# Altium integrated library MS-Electronic.IntLib: 363 symbols (part 1 of 2) (continued)
## Fuse_0ZCJ0012FF2E (continued)
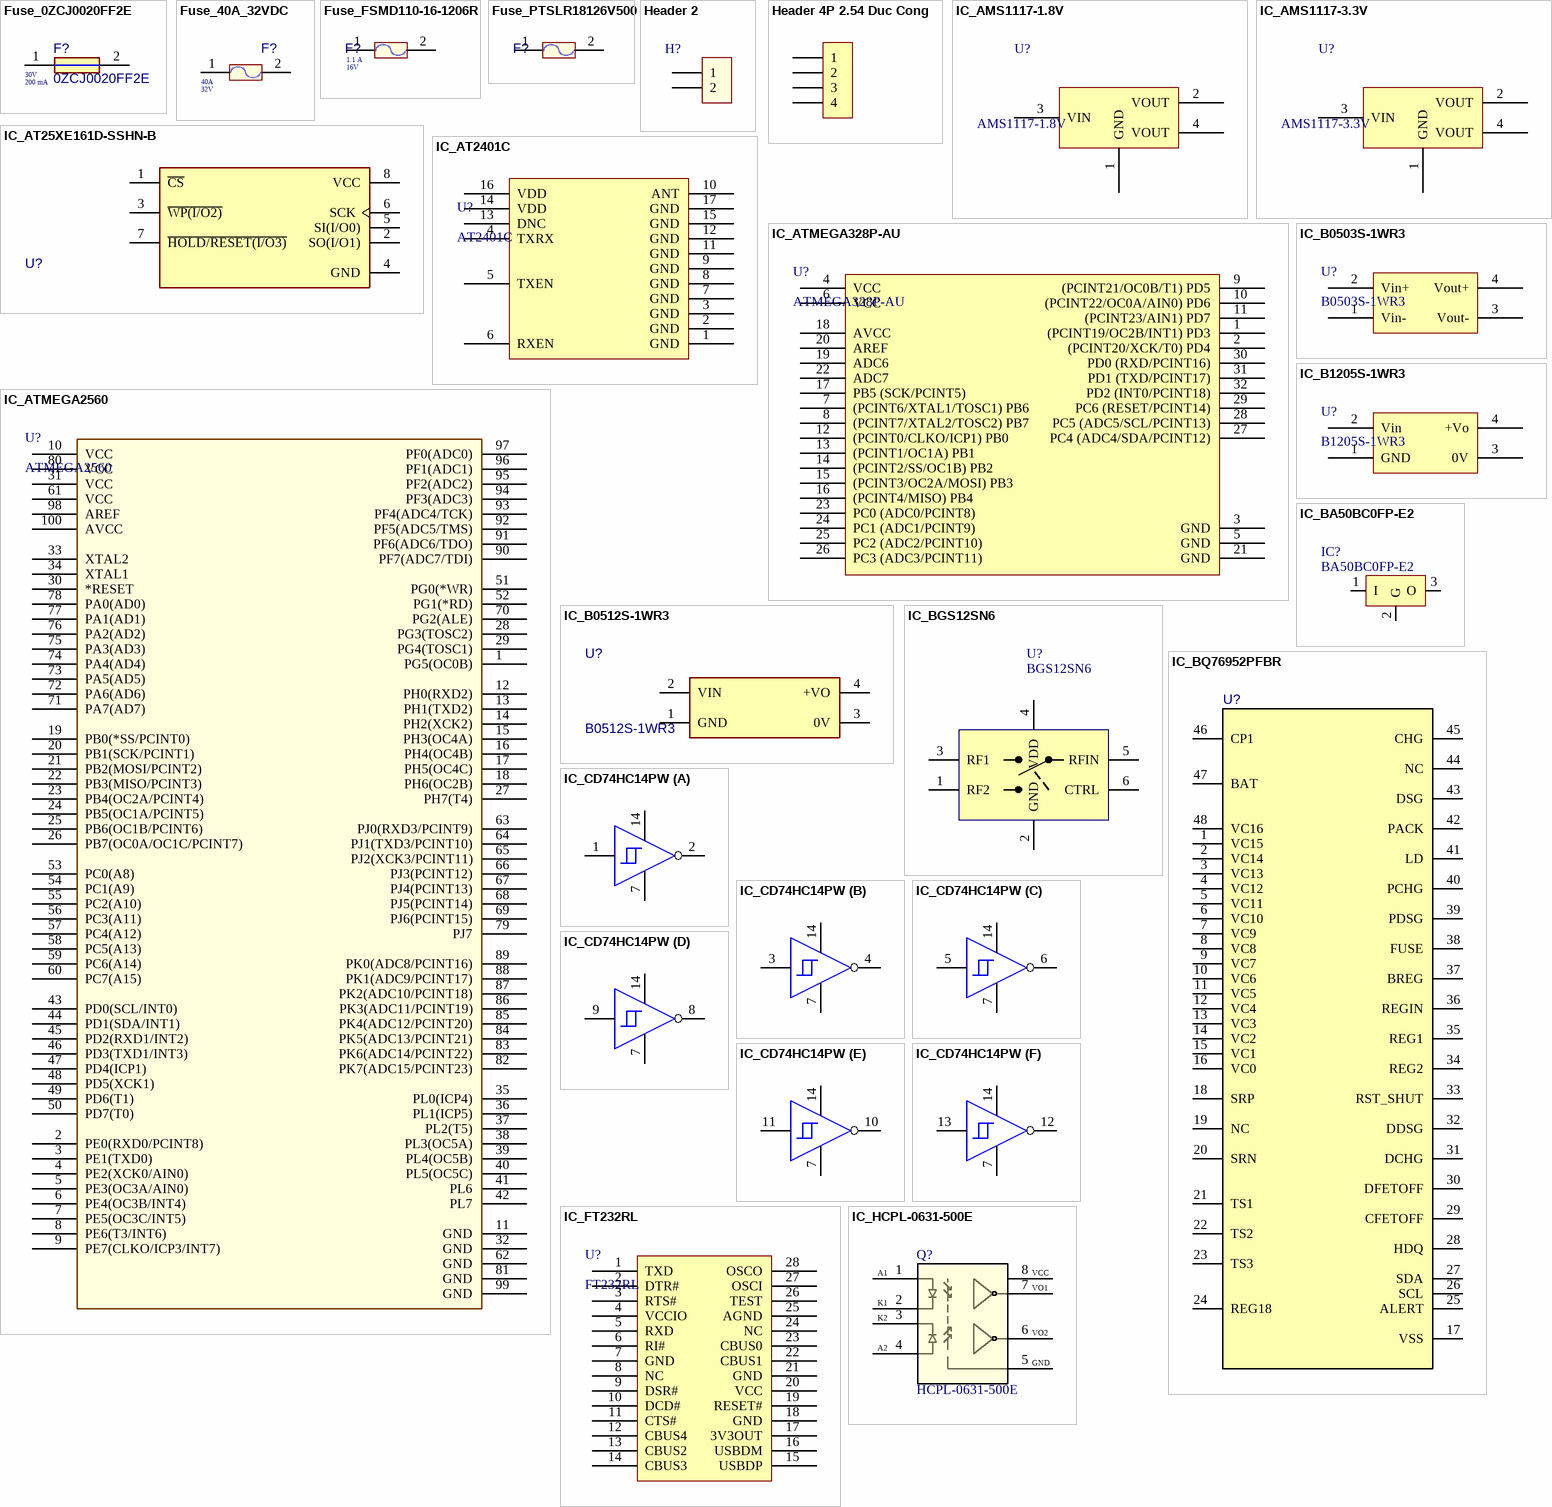
[diagram p3: symbols Fuse_0ZCJ0020FF2E to IC_HCPL-0631-500E]

## Fuse_0ZCJ0020FF2E
designator F?, comment 0ZCJ0020FF2E  Current - Hold (Ih) (Max): 200 mA  Voltage - Max: 30V
PTC RESET FUSE 30V 200MA 1206; Manufacturer: Bel Circuit Protection; Current - Trip (It): 400 mA; Current - Max: 10 A; Part Number: 0ZCJ0020FF2E; Description SEL: PTC RESET FUSE 30V 200MA 1206; Size: 1206; ComponentLink1Description: TGIC; ComponentLink1URL: https://www.thegioiic.com/0zcj0020ff2e-cau-chi-tu-phuc-hoi-1206-30v-200ma; ComponentLink2Description: DIGIKEY; ComponentLink2URL: https://www.digikey.com/en/products/detail/bel-fuse-inc/0ZCJ0020FF2E/4156326; Sort: PTC RESET
footprint FUSE_0ZCJ0020FF2E
pins: 1, 2

## Fuse_40A_32VDC
designator F?, comment Voltage Rating - DC: 32V  Current Rating (Amps): 40A  (hidden comment: 0287030.PXCN)
40 A AC 32 V DC Fuse Automotive Requires Holder Blade, ATO/ATC; Manufacturer: LITTELFUSE; Part Number: 0287040.PXCN; Description SEL: FUSE AUTOMOTIVE 40A 32VDC BLADE; Sort: AUTO; Footprint Type: TH; ComponentLink1Description: LKCL; ComponentLink1URL: https://linhkienchatluong.vn/cau-chi-dep-o-to-xe-may/cau-chi-dep-40a-32v-chan-nho-cho-o-to-xe-may_sp996_ct14638.aspx; ComponentLink2Description: DIGIKEY; ComponentLink2URL: https://www.digikey.bg/en/products/detail/littelfuse-inc/0287040-PXCN/2519817?s=N4IgTCBcDaIAxgBwHY4BY4DoAKANAwgHIgC6AvkA; Package: 0.752" L x 0.201" W x 0.484" H (19.10mm x 5.10mm x 12.30mm)
footprint FUSE_TH_30A
pins: 1, 2

## Fuse_FSMD110-16-1206R
designator F?, comment Voltage - Max: 16V  Current - Hold (Ih) (Max): 1.1 A  (hidden comment: FSMD110-16-1206R)
RESETTABLE FUSE - SMD, 1206 SIZE; Current - Trip (It): 2.2 A; Current - Max: 100 A; Description SEL: RESETTABLE FUSE - SMD, 1206 SIZE; Part Number: FSMD110-16-1206R; ComponentLink1Description: New link; Sort: RESETTABLE; Package: 1206
footprint FUSE_1206
pins: 1, 2

## Fuse_PTSLR18126V500
designator F?, comment PTSLR18126V500  (value not drawn)
Polymeric PTC Resettable Fuse 6V 5 A Ih Surface Mount 1812 (4532 Metric), Concave; Manufacturer: Eaton - Electronics Division; Value: 5A/6V; Manufacturer Part Number: PTSLR18126V500; ComponentLink1Description: DIGIKEY; ComponentLink1URL: https://www.digikey.bg/en/products/detail/eaton-electronics-division/PTSLR18126V500/12313952; ComponentLink2Description: CXT; ComponentLink2URL: https://linhkien.cxtvn.com/8771-cau-chi-tu-phuc-hoi-pptc-smd1812.html
footprint FUSE_0ZCG0200AF2B
pins: 1, 2

## Header 2
designator H?
Header 2 (Green); Voltage: 300V; Current: 15A; Pitch: 5.08mm; ComponentLink1Description: BLK; ComponentLink1URL: https://banlinhkien.com/con-2-2edg5.082p-5.08mm-xanh-cong-p6651835.html
footprint Header2T
pins: 1, 2

## Header 4P 2.54 Duc Cong
designator H?  (value not drawn)
Header 4P XH2.54-4P Đực Cong; Pitch: 2.54mm; Number Pin: 4; ComponentLink1Description: BLK; ComponentLink1URL: https://banlinhkien.com/header-4p-xh2.544p-duc-cong-10-chiec-p22290874.html
footprint Header 4P 2.54 Duc Cong
pins: 1, 2, 3, 4

## IC_AMS1117-1.8V
designator U?, comment AMS1117-1.8V
Linear Voltage Regulator IC Positive Fixed 1 Output 1A SOT-223-3L; Vout: 1.8V; Vin Max: 18V; ComponentLink1Description: BLK; ComponentLink1URL: https://banlinhkien.com/ams11171.8v-sot223-p6651250.html; Current Max: 1A; Package: SOT-223; Sort: SOT-223
footprint SOT223
pins: 1 GND, 2 VOUT, 3 VIN, 4 VOUT

## IC_AMS1117-3.3V
designator U?, comment AMS1117-3.3V
Linear Voltage Regulator IC Positive Fixed 1 Output 1A SOT-223-3L; Vin Max: 15V; Vout: 3.3; Sort: LDO; ComponentLink1Description: BLK; ComponentLink1URL: https://banlinhkien.com/ams11173.3v-sot223-p6651251.html; Current Max: 1A; Package: SOT-223
footprint SOT223
pins: 1 GND, 2 VOUT, 3 VIN, 4 VOUT

## IC_AT25XE161D-SSHN-B
designator U?, comment AT25XE161D-SSHN-B  (value not drawn)
NOR Flash 16 Mbit, Wide Vcc (1.65V to 3.6V); Manufacturer: Renesas Electronics Corporation; Description SEL: IC FLASH 16MBIT SPI/QUAD 8SOIC; Cross Component: W25Q80DVSSIG; Part Number: AT25XE161D-SSHN-B; ComponentLink1Description: DIGIKEY; ComponentLink1URL: https://www.digikey.bg/en/products/detail/renesas-electronics-corporation/AT25XE161D-SSHN-B/18717039; Sort: FLASH
footprint IC_AT25XE161D-SSHN-B
pins: 1 ~{CS}, 2 SO(I/O1), 3 ~{WP(I/O2)}, 4 GND, 5 SI(I/O0), 6 SCK, 7 ~{HOLD/RESET(I/O3)}, 8 VCC

## IC_AT2401C
designator U?, comment AT2401C
ZigBee 2V~3.6V QFN-16-EP(3x3) RF Front End Circuits ROHS; Sort: RF and Wireless; ComponentLink1Description: Aliexpress; ComponentLink1URL: https://vi.aliexpress.com/i/1005004853615083.html?gatewayAdapt=glo2vnm; Package: QFN-16-EP(3x3); ComponentLink2Description: LCSC; ComponentLink2URL: https://www.lcsc.com/product-detail/RF-Front-End-Circuits_ZHONGKEWEI-AT2401C_C783588.html
footprint IC_AT2401C
pins: 1 GND, 2 GND, 3 GND, 4 TXRX, 5 TXEN, 6 RXEN, 7 GND, 8 GND, 9 GND, 10 ANT, 11 GND, 12 GND, 13 DNC, 14 VDD, 15 GND, 16 VDD, 17 GND

## IC_ATMEGA328P-AU
designator U?, comment ATMEGA328P-AU
AVR AVR® ATmega Microcontroller IC 8-Bit 20MHz 32KB (16K x 16) FLASH 32-TQFP (7x7); Sort: MCU; ComponentLink1Description: New link; ComponentLink1URL: https://banlinhkien.com/atmega328pau-tqfp32-p6653725.html; Package: 32-TQFP
footprint IC_ATMEGA328P-AU
pins: 1 (PCINT19/OC2B/INT1) PD3, 2 (PCINT20/XCK/T0) PD4, 3 GND, 4 VCC, 5 GND, 6 VCC, 7 (PCINT6/XTAL1/TOSC1) PB6, 8 (PCINT7/XTAL2/TOSC2) PB7, 9 (PCINT21/OC0B/T1) PD5, 10 (PCINT22/OC0A/AIN0) PD6, 11 (PCINT23/AIN1) PD7, 12 (PCINT0/CLKO/ICP1) PB0, 13 (PCINT1/OC1A) PB1, 14 (PCINT2/SS/OC1B) PB2, 15 (PCINT3/OC2A/MOSI) PB3, 16 (PCINT4/MISO) PB4, 17 PB5 (SCK/PCINT5), 18 AVCC, 19 ADC6, 20 AREF, 21 GND, 22 ADC7, 23 PC0 (ADC0/PCINT8), 24 PC1 (ADC1/PCINT9), 25 PC2 (ADC2/PCINT10), 26 PC3 (ADC3/PCINT11), 27 PC4 (ADC4/SDA/PCINT12), 28 PC5 (ADC5/SCL/PCINT13), 29 PC6 (RESET/PCINT14), 30 PD0 (RXD/PCINT16), 31 PD1 (TXD/PCINT17), 32 PD2 (INT0/PCINT18)

## IC_ATMEGA2560
designator U?, comment ATMEGA2560
AVR AVR® ATmega Microcontroller IC 8-Bit 16MHz 256KB (128K x 16) FLASH 100-TQFP (14x14); Sort: MCU; ComponentLink1Description: New link; ComponentLink1URL: https://banlinhkien.com/atmega256016au-tqfp100-p6649411.html; Package: 100-TQFP
footprint IC_ATMEGA2560AU
pins: 1 PG5(OC0B), 2 PE0(RXD0/PCINT8), 3 PE1(TXD0), 4 PE2(XCK0/AIN0), 5 PE3(OC3A/AIN0), 6 PE4(OC3B/INT4), 7 PE5(OC3C/INT5), 8 PE6(T3/INT6), 9 PE7(CLKO/ICP3/INT7), 10 VCC, 11 GND, 12 PH0(RXD2), 13 PH1(TXD2), 14 PH2(XCK2), 15 PH3(OC4A), 16 PH4(OC4B), 17 PH5(OC4C), 18 PH6(OC2B), 19 PB0(*SS/PCINT0), 20 PB1(SCK/PCINT1), 21 PB2(MOSI/PCINT2), 22 PB3(MISO/PCINT3), 23 PB4(OC2A/PCINT4), 24 PB5(OC1A/PCINT5), 25 PB6(OC1B/PCINT6), 26 PB7(OC0A/OC1C/PCINT7), 27 PH7(T4), 28 PG3(TOSC2), 29 PG4(TOSC1), 30 *RESET, 31 VCC, 32 GND, 33 XTAL2, 34 XTAL1, 35 PL0(ICP4), 36 PL1(ICP5), 37 PL2(T5), 38 PL3(OC5A), 39 PL4(OC5B), 40 PL5(OC5C), 41 PL6, 42 PL7, 43 PD0(SCL/INT0), 44 PD1(SDA/INT1), 45 PD2(RXD1/INT2), 46 PD3(TXD1/INT3), 47 PD4(ICP1), 48 PD5(XCK1), 49 PD6(T1), 50 PD7(T0), 51 PG0(*WR), 52 PG1(*RD), 53 PC0(A8), 54 PC1(A9), 55 PC2(A10), 56 PC3(A11), 57 PC4(A12), 58 PC5(A13), 59 PC6(A14), 60 PC7(A15), 61 VCC, 62 GND, 63 PJ0(RXD3/PCINT9), 64 PJ1(TXD3/PCINT10), 65 PJ2(XCK3/PCINT11), 66 PJ3(PCINT12), 67 PJ4(PCINT13), 68 PJ5(PCINT14), 69 PJ6(PCINT15), 70 PG2(ALE), 71 PA7(AD7), 72 PA6(AD6), 73 PA5(AD5), 74 PA4(AD4), 75 PA3(AD3), 76 PA2(AD2), 77 PA1(AD1), 78 PA0(AD0), 79 PJ7, 80 VCC, 81 GND, 82 PK7(ADC15/PCINT23), 83 PK6(ADC14/PCINT22), 84 PK5(ADC13/PCINT21), 85 PK4(ADC12/PCINT20), 86 PK3(ADC11/PCINT19), 87 PK2(ADC10/PCINT18), 88 PK1(ADC9/PCINT17), 89 PK0(ADC8/PCINT16), 90 PF7(ADC7/TDI), 91 PF6(ADC6/TDO), 92 PF5(ADC5/TMS), 93 PF4(ADC4/TCK), 94 PF3(ADC3), 95 PF2(ADC2), 96 PF1(ADC1), 97 PF0(ADC0), 98 AREF, 99 GND, 100 AVCC

## IC_B0503S-1WR3
designator U?, comment B0503S-1WR3
Isolated Module DC DC Converter 1 Output 3.3V 303mA 4.5V - 5.5V Input; Sort: Module Isolated DC-DC; ComponentLink1Description: HS; ComponentLink1URL: https://hshop.vn/nguon-cach-ly-dc-dc-isolated-power-module-hi-link-hlk-b0503s-1wr3-5vdc-to-3-3vdc-1w; ComponentLink2Description: DIGIKEY; ComponentLink2URL: https://www.digikey.bg/en/products/detail/mornsun-america-llc/B0503S-1WR3/13168314?s=N4IgTCBcDaIEIAYCsCDMBlAtARgOoCVUQBdAXyA
footprint IC_B0503S-1WR3
pins: 1 Vin-, 2 Vin+, 3 Vout-, 4 Vout+

## IC_B0512S-1WR3
designator U?, comment B0512S-1WR3
Isolated Module DC DC Converter 1 Output 12V 84mA 4.5V - 5.5V Input; Power: 1W; Description SEL: DC DC CONVERTER 12V 1W; Part Number: B0512S-1WR3; Input: 4.5V-5.5V; Output: 12V; Current: 84mA; ComponentLink1Description: CXT; ComponentLink1URL: https://linhkien.cxtvn.com/6106-b0512s-1wr3-dc-dc-converter-12v-1w.html; ComponentLink2Description: DIGIKEY; ComponentLink2URL: https://www.digikey.at/en/products/detail/mornsun-america-llc/B0512S-1WR3/13168229?s=N4IgTCBcDaIEIAYCsBGMBlAtCg6gJQGYQBdAXyA
footprint IC_ROE-0512S
pins: 1 GND (power), 2 VIN, 3 0V, 4 +VO

## IC_B1205S-1WR3
designator U?, comment B1205S-1WR3
Isolated Module DC DC Converter 1 Output 5V 200mA 10.8V - 13.2V Input; Sort: DC DC CONVERTER 5V 1W; ComponentLink1Description: HS; ComponentLink1URL: https://hshop.vn/nguon-cach-ly-dc-dc-isolated-power-module-hi-link-hlk-b1205s-1wr3-12vdc-to-5vdc-1w; ComponentLink2Description: DIGIKEY; ComponentLink2URL: https://www.digikey.com/en/products/detail/mornsun-america-llc/B1205S-1WR3/13968668?s=N4IgTCBcDaIEIEYwAYCsBlAtAg6gJQGYQBdAXyA
footprint IC_B0503S-1WR3
pins: 1 GND, 2 Vin, 3 0V, 4 +Vo

## IC_BA50BC0FP-E2
designator IC?, comment BA50BC0FP-E2
IC REG LINEAR 5V 1A TO252-2; Manufacture: Rohm Semiconductor; ComponentLink2Description: DIGIKEY; ComponentLink2URL: https://www.digikey.com/en/products/detail/rohm-semiconductor/BA50BC0FP-E2/722207?s=N4IgTCBcDaIEIEECsAGOBhFAxACgWgFEIBdAXyA; Footprint type: SMD; Category: IC; Part Number: BA50BC0FP-E2
footprint IC_BA50BC0FP-E2
pins: 1 I (power), 2 G (power), 3 O (power)

## IC_BGS12SN6
designator U?, comment BGS12SN6
DC switch - Ultra-Low  SPDT analog switch; Manufacturer: INFINEON; Sort: RF Switch; Manufacturer_Part_Number: BGS12SN6; ComponentLink1Description: MOUSER; ComponentLink1URL: https://www.mouser.vn/ProductDetail/Infineon-Technologies/BGS12SN6E6327XTSA1?qs=3%2FhYFTG7CVeGtqdjCCQooA%3D%3D
footprint SON40P70X40-6N (SON, 6-Leads, Body 1.10x0.70mm, Pitch 0.40mm)
pins: 1 RF2, 2 GND, 3 RF1, 4 VDD, 5 RFIN, 6 CTRL

## IC_BQ76952PFBR
designator U?, comment BQ76952PFBR  (value not drawn)
IC BAT LIFEPO4/LI-ION 3-16C TQFP; Manufacturer: Texas Instruments; Point: 48; Part Number: BQ76952PFBR; Description SEL: IC BAT LIFEPO4/LI-ION 3-16C TQFP; ComponentLink1Description: DIGIKEY; ComponentLink1URL: https://www.digikey.com/en/products/detail/texas-instruments/BQ76952PFBR/13427864
footprint IC_BQ76952PFBR
pins: 1 VC15, 2 VC14, 3 VC13, 4 VC12, 5 VC11, 6 VC10, 7 VC9, 8 VC8, 9 VC7, 10 VC6, 11 VC5, 12 VC4, 13 VC3, 14 VC2, 15 VC1, 16 VC0, 17 VSS, 18 SRP, 19 NC, 20 SRN, 21 TS1, 22 TS2, 23 TS3, 24 REG18, 25 ALERT, 26 SCL, 27 SDA, 28 HDQ, 29 CFETOFF, 30 DFETOFF, 31 DCHG, 32 DDSG, 33 RST_SHUT, 34 REG2, 35 REG1, 36 REGIN, 37 BREG, 38 FUSE, 39 PDSG, 40 PCHG, 41 LD, 42 PACK, 43 DSG, 44 NC, 45 CHG, 46 CP1, 47 BAT, 48 VC16

## IC_CD74HC14PW
designator U?, comment CD74HC14PW  (value not drawn)
IC INVERTER 6CH 1-INP 14TSSOP; Manufacturer: Texas Instruments; Voltage - Supply: 2V ~ 6V; Input Logic Level - Low: 0.3V ~ 1.2V; Input Logic Level - High: 1.5V ~ 4.2V; Number of Chanel: 6; Part Number: CD74HC14PW; Footprint/Package: 14-TSSOP; Sort: IC INVERTER; ComponentLink1Description: DIGIKEY; ComponentLink1URL: https://www.digikey.com/en/products/detail/texas-instruments/CD74HC14PW/1506665
footprint IC_CD74HC14PW
part A pins: 1 1A, 2 1Y, 7 GND, 14 VCC
part B pins: 3 2A, 4 2Y, 7 GND, 14 VCC
part C pins: 5 3A, 6 3Y, 7 GND, 14 VCC
part D pins: 7 GND, 8 4Y, 9 4A, 14 VCC
part E pins: 7 GND, 10 5Y, 11 5A, 14 VCC
part F pins: 7 GND, 12 6Y, 13 6A, 14 VCC

## IC_FT232RL
designator U?, comment FT232RL
USB FULL SPEED TO SERIAL UART IC; Sort: USB FS SERIAL UART; ComponentLink1Description: LKCG; ComponentLink1URL: https://lkcg.vn/linh-kien-ic-ft232rl-chan-dan-ssop28; ComponentLink2Description: DIGIKEY; ComponentLink2URL: https://www.digikey.bg/en/products/detail/ftdi-future-technology-devices-international-ltd/FT232RNL-REEL/16836345
footprint IC_FT232RL
pins: 1 TXD, 2 DTR#, 3 RTS#, 4 VCCIO, 5 RXD, 6 RI#, 7 GND, 8 NC, 9 DSR#, 10 DCD#, 11 CTS#, 12 CBUS4, 13 CBUS2, 14 CBUS3, 15 USBDP, 16 USBDM, 17 3V3OUT, 18 GND, 19 RESET#, 20 VCC, 21 GND, 22 CBUS1, 23 CBUS0, 24 NC, 25 AGND, 26 TEST, 27 OSCI, 28 OSCO

## IC_HCPL-0631-500E
designator Q?, comment HCPL-0631-500E
OPTOISO 3.75KV 2CH OPEN COLL 8SO; Mfr_Name: Broadcom; Type: Optoisolators; ComponentLink1Description: LKD; ComponentLink1URL: https://banlinhkiendientu.vn/hcpl-0631/; ComponentLink2Description: DIGIKEY; ComponentLink2URL: https://www.digikey.com/en/products/detail/broadcom-limited/HCPL-0631-500E/768373; MSL: 1; Temperature: -40°C ~ 85°C
footprint IC_HCPL-0631-500E
pins: 1, 2, 3, 4, 5 GND, 6, 7, 8
text: A1; VCC; VO1; K1; K2; VO2; A2

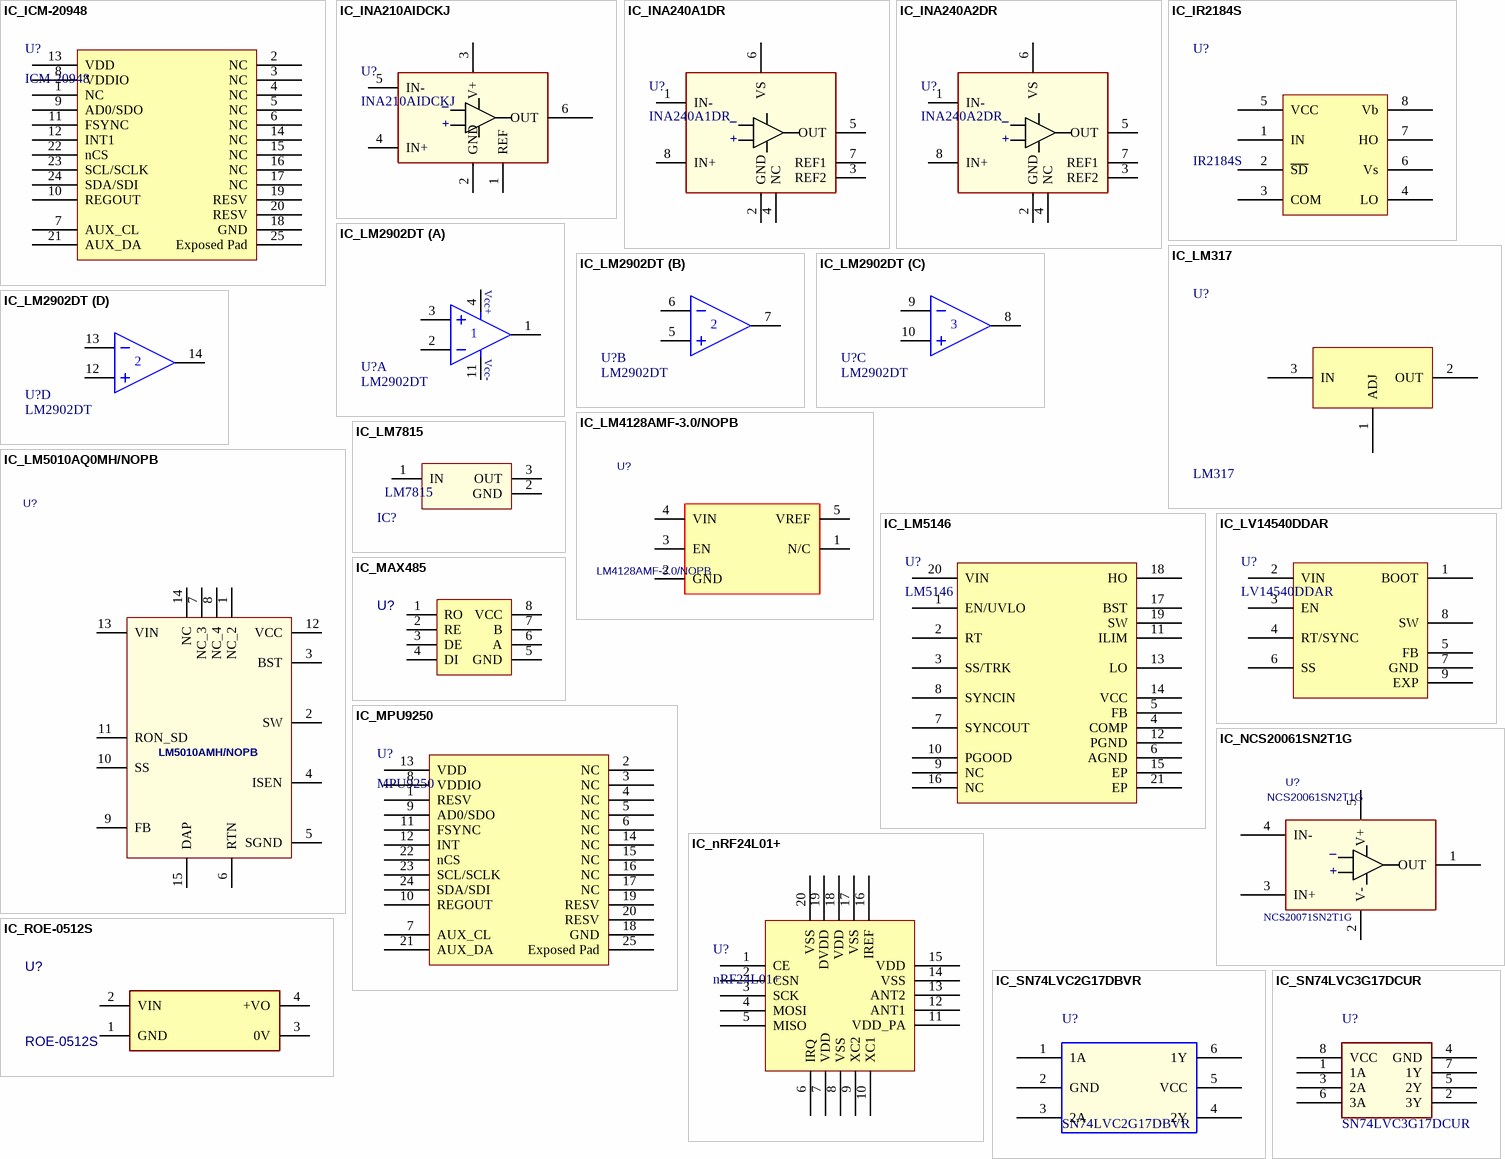
[diagram p4: symbols IC_ICM-20948 to IC_SN74LVC3G17DCUR]

## IC_ICM-20948
designator U?, comment ICM-20948
Accelerometer, Gyroscope, Magnetometer, 9 Axis Sensor I2C, SPI Output; Sort: IMU; ComponentLink1Description: DIGIKEY; ComponentLink1URL: https://www.digikey.com/en/products/detail/tdk-invensense/ICM-20948/6623535; Package: 24-QFN
footprint IC_MPU9250
pins: 1 NC, 2 NC, 3 NC, 4 NC, 5 NC, 6 NC, 7 AUX_CL, 8 VDDIO, 9 AD0/SDO, 10 REGOUT, 11 FSYNC, 12 INT1, 13 VDD, 14 NC, 15 NC, 16 NC, 17 NC, 18 GND, 19 RESV, 20 RESV, 21 AUX_DA, 22 nCS, 23 SCL/SCLK, 24 SDA/SDI, 25 Exposed Pad

## IC_INA210AIDCKJ
designator U?, comment INA210AIDCKJ
Current Sense Amplifier 1 Circuit Single-Ended SC-70-6; Manufacturer: Texas Instruments; Voltage - Supply: 2.7 - 26V; Current - Supply: 65uA; Part Number: INA210AIDCKJ; Output Type: Single-Ended; Package: SC-70-6; ComponentLink1Description: DIGIKEY; ComponentLink1URL: https://www.digikey.com/en/products/detail/texas-instruments/INA210AIDCKJ/23331470
footprint IC_INA210AIDCKJ
pins: 1 REF, 2 GND, 3 V+, 4 IN+, 5 IN-, 6 OUT
text: _; +

## IC_INA240A1DR
designator U?, comment INA240A1DR
IC CURRENT SENSE 1 CIRCUIT 8SOIC; Manufacturer: Texas Instruments; Voltage - Supply: 2.7 - 5.5V; Current - Supply: 1.8mA; Part Number: INA240A1DR; Package: 8-SOIC; ComponentLink1Description: DIGIKEY; ComponentLink1URL: https://www.digikey.com/en/products/detail/texas-instruments/INA240A1DR/8538109
footprint IC_INA240A1DR_SOIC8
pins: 1 IN-, 2 GND, 3 REF2, 4 NC, 5 OUT, 6 VS, 7 REF1, 8 IN+
text: _; +

## IC_INA240A2DR
designator U?, comment INA240A2DR
IC CURRENT SENSE 1 CIRCUIT 8SOIC; Manufacturer: Texas Instruments; Voltage - Supply: 2.7 - 5.5V; Current - Supply: 1.8mA; Part Number: INA240A2DR; Package: 8-SOIC; ComponentLink1Description: DIGIKEY; ComponentLink1URL: https://www.digikey.com/en/products/detail/texas-instruments/INA240A2DR/8538110
footprint IC_INA240A1DR_SOIC8
pins: 1 IN-, 2 GND, 3 REF2, 4 NC, 5 OUT, 6 VS, 7 REF1, 8 IN+
text: _; +

## IC_IR2184S
designator U?, comment IR2184S
Half-Bridge Driver; Manufacture: Infineon Technologies; Mouting Type: SMD; ComponentLink1Description: BLK; ComponentLink1URL: https://banlinhkien.com/ir2184s-sop8-600v-halfbridge-driver-1.4a1.8a-p6653151.html; ComponentLink2Description: Mouser; ComponentLink2URL: https://www.mouser.vn/ProductDetail/Infineon-Technologies/IR2184STRPBF?qs=ellYJlE8XiF5tKx1UCxEUw%3D%3D; Sort: Half-Bridge; Manufacture Part Number: IR2184S; MSL: 1; Temperature: -40°C ~ 150°C
footprint IC_IR2184S
pins: 1 IN, 2 ~{SD}, 3 COM, 4 LO, 5 VCC, 6 Vs, 7 HO, 8 Vb

## IC_LM317
designator U?, comment LM317
Linear Voltage Regulator IC Positive Adjustable 1 Output 1.5A TO-220; Manufacturer: Lumimax Optoelectronic Technology; Vin: 4.2V - 40V; Vout: 1.2V - 37V; Part Number: LM317; Current: 1.5A; Package: TO-220; ComponentLink1Description: BLK; ComponentLink1URL: https://banlinhkien.com/lm317t-to220-reg-ldo-adj-1.5a-p6651263.html; ComponentLink2Description: DIGIKEY; ComponentLink2URL: https://www.digikey.bg/en/products/detail/lumimax-optoelectronic-technology/LM317/24373406
footprint IC_LM7815
pins: 1 ADJ, 2 OUT, 3 IN

## IC_LM2902DT
designator U?, comment LM2902DT
IC OPAMP GP 4 CIRCUIT 14SOIC; Manufacturer: STMicroelectronics; Number of Circuits: 4; Output Type: Push-Pull; Gain Bandwidth Product: 800 kHz; Current - Input Bias: 20nA; Current - Output / Channel: 30mA; Voltage - Supply Span(Min-Max): 3-30V; Part Number: LM2902DT; Footprint/Package: 14-SOIC; Sort: OPAMP; ComponentLink1Description: DIGIKEY; ComponentLink1URL: https://www.digikey.com/en/products/detail/stmicroelectronics/LM2902DT/591659
footprint IC_LM2902DT_SOIC
part A pins: 1 OUT, 2 IN-, 3 IN+, 4 V+, 11 V-
part B pins: 5 IN+, 6 IN-, 7 OUT
part C pins: 8 OUT, 9 IN-, 10 IN+
part D pins: 12 IN+, 13 IN-, 14 OUT
part A text: Vcc+; Vcc-

## IC_LM4128AMF-3.0/NOPB
designator U?, comment LM4128AMF-3.0/NOPB
IC VREF SERIES 0.1% SOT23-5; Manufacturer: Texas Instruments; Sort: IC VREF; Vout: 3V; Current: 20 mA; Part Number: LM4128AMF-3.0/NOPB; Footprint/Package: SOT-23-THIN; Footprint type: SMD; Category: IC; ComponentLink1Description: DIGIKEY; ComponentLink1URL: https://www.digikey.com/en/products/detail/texas-instruments/LM4128AMF-3-0-NOPB/1247403
footprint DBV5_TEX-M
pins: 1 N/C, 2 GND, 3 EN, 4 VIN, 5 VREF

## IC_LM5010AQ0MH/NOPB
designator U?, comment Part Number: LM5010AMH/NOPB  (hidden comment: LM5010AQ0MH/NOPB)
IC REG BUCK ADJ 1A 14HTSSOP; Manufacturer: Texas Instruments; Application_BuildNumber: LM5010AQ0MH/NOPB; Footprint/Package: 14-HTSSOP; Footprint type: SMD; Category: IC
footprint IC_LM5010AQ0MH/NOPB
pins: 1 NC_2, 2 SW (power), 3 BST (power), 4 ISEN, 5 SGND (power), 6 RTN (power), 7 NC_3, 8 NC_4, 9 FB, 10 SS, 11 RON_SD, 12 VCC (power), 13 VIN (power), 14 NC, 15 DAP (power)

## IC_LM5146
designator U?, comment LM5146
Buck Regulator Positive Output Step-Down DC-DC Controller IC 20-VQFN (3.5x4.5); Manufacturer: Texas Instruments; Part Number: LM5146RGYR; Sort: IC REG BUCK; MSL: 2; ComponentLink1Description: DIGIKEY; ComponentLink1URL: https://www.digikey.bg/en/products/detail/texas-instruments/LM5146RGYR/14544372
footprint IC_LM5146
pins: 1 EN/UVLO, 2 RT, 3 SS/TRK, 4 COMP, 5 FB, 6 AGND, 7 SYNCOUT, 8 SYNCIN, 9 NC, 10 PGOOD, 11 ILIM, 12 PGND, 13 LO, 14 VCC, 15 EP, 16 NC, 17 BST, 18 HO, 19 SW, 20 VIN, 21 EP

## IC_LM7815
designator IC?, comment LM7815
Linear Voltage Regulator IC Positive Fixed 1 Output 1A TO-220-3; Manufacturer: Texas Instruments; Part Number: LM7815CT/NOPB; Vin: 35V; Vout: 15V; Current: 1A; Package: TO-220-3
footprint IC_LM7815
pins: 1 IN, 2 GND, 3 OUT
